# Altium footprint library boxer_pas.PcbLib: 67 footprints (part 2 of 5)
Each footprint in its own frame and in the unit in brackets; x right, y up, seen from the top. Pads: shape width x height; smd on the part's side, far side on the other; paste and mask are expansions set on the pad; w line width, h text height; cw(c..) or ccw(c..) is an arc to the next point about the centre after c.
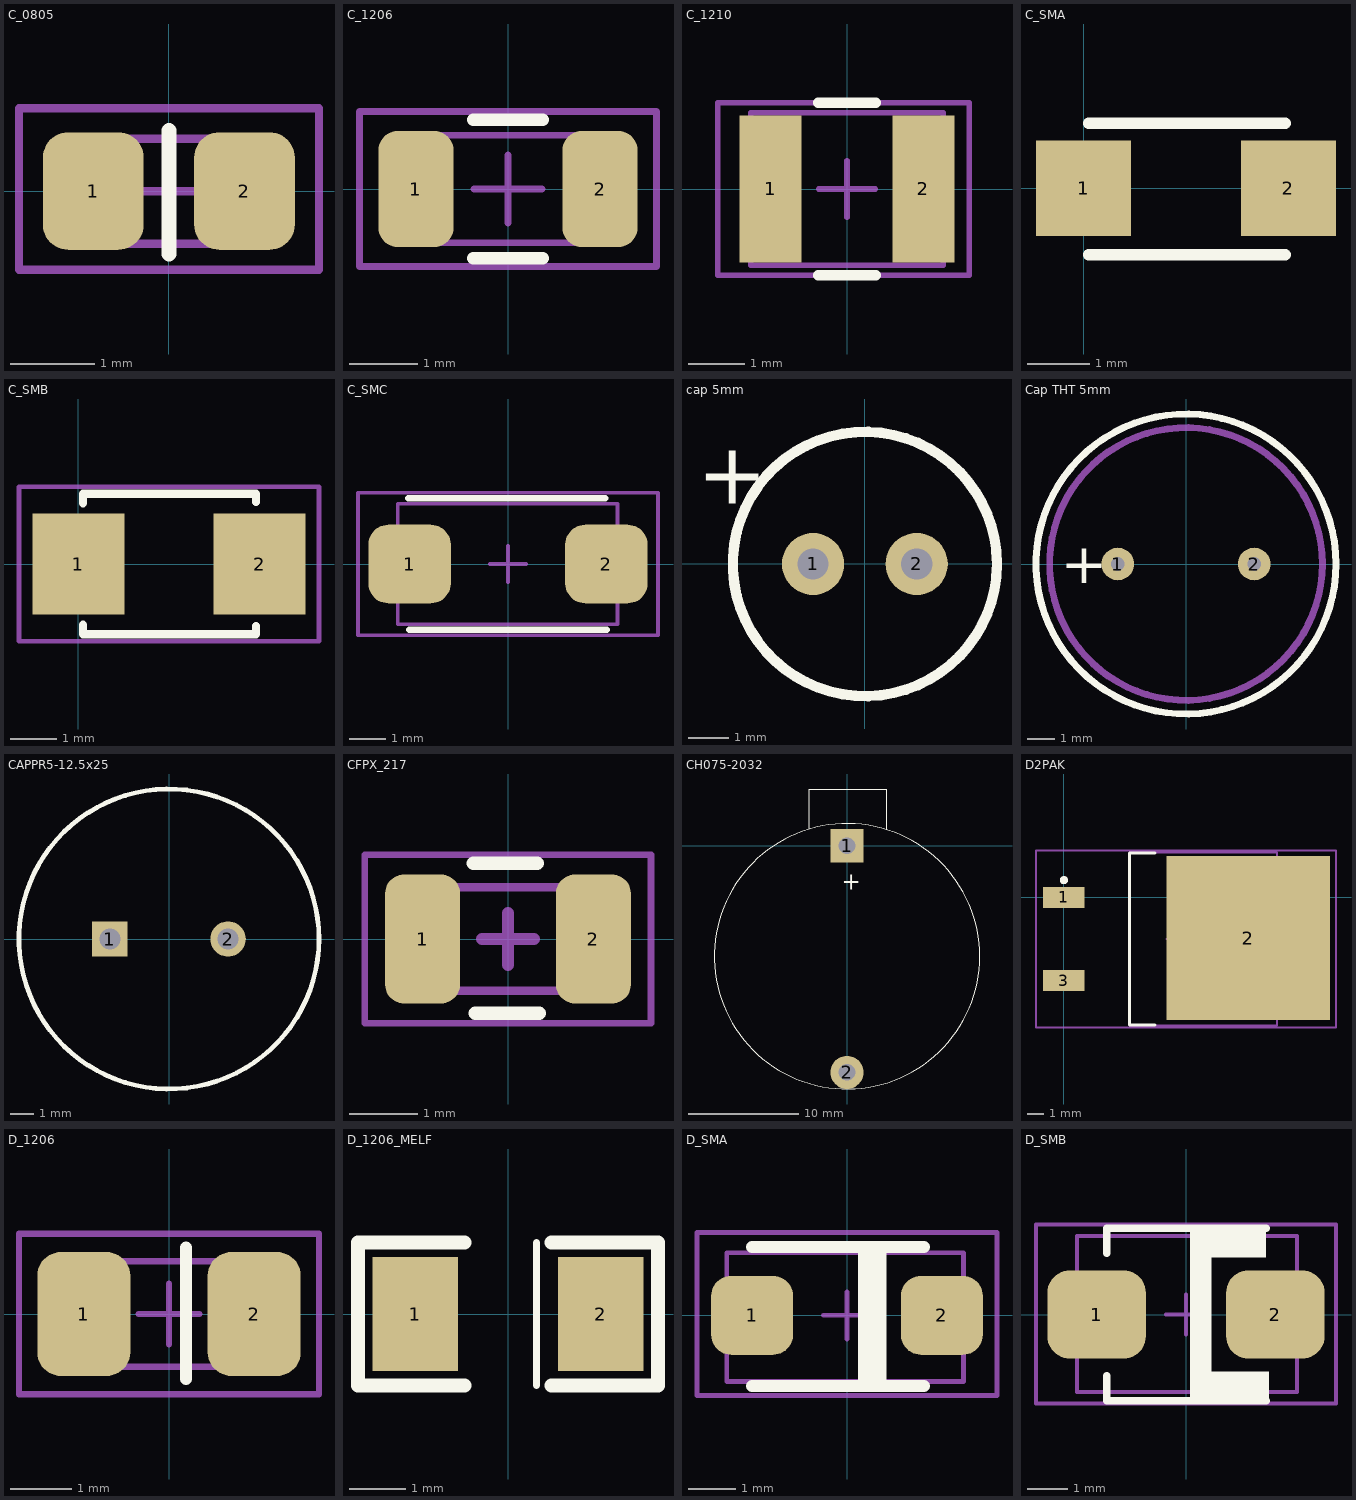
[diagram p1: the footprints below, top view; thin cyan lines are the x and y axes]

## C_0805 [mm] "Chip Capacitor, Body 2.0x1.3mm, IPC High Density"
height 1.4
pads (2):
  rrect50% 1.2x1.4 smd: 1(-0.9,0) 2(0.9,0)
Top Overlay:
  lines w0.18: 0,-0.75 0,0.723
Mechanical 13:
  lines w0.1: -1.011,-0.625 0.989,-0.625 0.989,0.625 -1.011,0.625 -1.011,-0.625
  text ".Value" at -0.925,-0.254 h0.5
  text ".Designator" at -1.651,1.067 h0.5
Mechanical 15:
  lines w0.1: -0.5,0 0.5,0 ; 0,-0.5 0,0.5 ; -1.784,-0.935 1.788,-0.935 1.788,0.986 -1.784,0.986 -1.784,-0.935
3D body "User Library-C0805-2.STEP": height 0.8, standoff 0, extent -1.011,-0.625 0.989,0.625

## C_1206 [mm] "Chip Capacitor, Body 3.2x1.6mm, IPC High Density"
height 1.3
pads (2):
  rrect50% 1.1x1.7 smd: 1(-1.35,0) 2(1.35,0)
Top Overlay:
  lines w0.18: -0.508,-1.016 0.508,-1.016 ; -0.508,1.016 0.508,1.016
Mechanical 13:
  lines w0.1: -1.6,-0.787 -1.6,0.787 1.6,0.787 1.6,-0.787 -1.6,-0.787
  text ".Value" at -0.94,-0.178 h0.5
  text ".Designator" at -1.782,1.147 h0.5
Mechanical 15:
  lines w0.1: -0.5,0 0.5,0 ; 0,-0.5 0,0.5 ; -2.18,-1.138 -2.18,1.138 2.18,1.138 2.18,-1.138 -2.18,-1.138
3D body "User Library-1206 SMD Capacitor.step": height 1, standoff 0, extent -1.6,-0.8 1.6,0.8

## C_1210 [mm] "Chip Capacitor, Body 3.2x2.5mm, IPC High Density"
height 1.3
pads (2):
  rect 1.1x2.6 smd: 1(-1.35,0) 2(1.35,0)
Top Overlay:
  lines w0.18: -0.508,-1.524 0.508,-1.524 ; -0.508,1.524 0.508,1.524
Mechanical 13:
  lines w0.1: -1.7,-1.35 1.7,-1.35 1.7,1.35 -1.7,1.35 -1.7,-1.35
  text ".Value" at -0.965,-0.178 h0.5
  text ".Designator" at -1.731,1.604 h0.5
Mechanical 15:
  lines w0.1: -0.5,0 0.5,0 ; 0,-0.5 0,0.5 ; -2.286,-1.524 2.159,-1.524 2.159,1.524 -2.286,1.524 -2.286,-1.524
3D body "User Library-cap1210.STEP": height 0.95, standoff -0.01, extent -2.128,-1.382 2.072,1.318

## C_SMA [mil] "TAJ Series Standard Tantalum"
height 62.99
pads (2):
  rect 60x60 smd: 1(0,0) 2(129,0)
Top Overlay:
  lines w7.09: 3,-42 127,-42 ; 3,41 127,41
3D body "User Library-CAP_TANT_3216-18_A_case-1.step": height 66.93, standoff 0, extent -1.93,-36 131.93,34.87

## C_SMB [mm]
pads (2):
  rect 2x2.2 smd: 1(0,0) 2(3.937,0)
Top Overlay:
  lines w0.18: 0.102,-1.321 0.102,-1.524 3.861,-1.524 3.861,-1.346 ; 0.102,1.321 0.102,1.524 3.861,1.524 3.861,1.346
Mechanical 13:
  text ".Value" at 0.864,-0.152 h0.5
  text ".Designator" at 0.199,1.782 h0.5
Mechanical 15:
  lines w0.1: -1.291,-1.676 -1.291,1.676 5.228,1.676 5.228,-1.676 -1.291,-1.676
3D body "User Library-Tantalum Capacitor Case B.STEP": height 2.09, standoff -0.01, extent 0.136,-1.474 3.826,1.346

## C_SMC [mil] "TAJ Series Standard Tantalum"
height 102.36
pads (2):
  rrect50% 90x86 smd: 1(-107.5,0) 2(107.5,0)
Top Overlay:
  lines w7.09: -109,72 106,72 ; -108,-72 108,-72
Mechanical 13:
  lines w3.94: -120.57,-65.94 -120.57,65.95 119.59,65.95 119.59,-65.94 -120.57,-65.94
  text ".Value" at -37,-8 h19.68
  text ".Designator" at -75.17,79.14 h19.68
Mechanical 15:
  lines w3.94: -19.69,0 19.68,0 ; 0,-19.69 0,19.68 ; -163.81,-77.75 163.81,-77.75 163.81,77.76 -163.81,77.76 -163.81,-77.75
3D body "User Library-C_case.STEP": height 106.3, standoff 0, extent -120.57,-65.94 119.59,65.95

## cap 5mm [mil]
pads (2):
  round 60 hole 30: 1(-50,0) 2(50,0)
Top Overlay:
  circle w10: c0,0 r127.48
  text "+" at -162,58 h59.06
3D body: height 314.96, standoff 0, extent -118.29,-115 117,120.76

## Cap THT 5mm [mm] "DRE5/2.5 raster 5mm, 10x20mm"
height 20
pads (2):
  round 1.2 hole 0.5: 1(-2.5,0) 2(2.5,0)
Top Overlay:
  circle w0.254: c0,0 r5.5
  text "+" at -4.597,-0.711 h1.5
Mechanical 13:
  circle w0.254: c0,0 r5
3D body: height 12, standoff 0, extent -4.96,-4.99 5,4.99

## CAPPR5-12.5x25 [mm] "Capacitor, Electrolytic, Radial; Body 12.5 x 25 mm (Dia.xH typ); Pin Spacing 5 mm (typ)"
height 22
pads (2):
  rect 1.5x1.5 hole 0.9: 1(-2.5,0)
  round 1.5 hole 0.9: 2(2.5,0)
Top Overlay:
  circle w0.2: c0,0 r6.35
3D body "User Library-Cap-EL(12_5x25-5)T.step": height 25.5, standoff -3.5, extent -6.278,-6.177 6.224,6.323

## CFPX_217 [mm] "3.2 x 1.5mm SMD crystal"
height 1
pads (2):
  rrect50% 1.1x1.9 smd: 1(-1.257,0) 2(1.257,0)
Top Overlay:
  lines w0.2: -0.508,1.118 0.432,1.118 ; -0.483,-1.092 0.457,-1.092
Mechanical 13:
  lines w0.127: -1.572,-0.76 -1.572,0.76 1.648,0.76 1.648,-0.76 -1.572,-0.76
  text ".Designator" at -1.808,1.172 h0.5
  text ".Value" at -0.914,-0.203 h0.5
Mechanical 15:
  lines w0.1: -2.108,-1.24 2.103,-1.24 2.103,1.24 -2.108,1.24 -2.108,-1.24
  lines w0.18: -0.381,0 0,0 ; 0,-0.381 0,0 ; 0,0.381 0,0 ; 0.381,0 0,0
3D body "User Library-ABS07.STEP": height 0.91, standoff 0, extent -1.572,-0.76 1.648,0.76

## CH075-2032 [mm] "Battery Holder, Size: CR2023"
pads (2):
  rect 3x3 hole 1.5: 1(0,0)
  round 3 hole 1.5: 2(0,-20.5)
Top Overlay:
  circle w0.1: c0,-10 r12
  lines w0.1: -3.429,1.506 -3.429,5.133 3.581,5.133 3.581,1.481
  text "+" at -0.466,-3.974 h1.52

## D2PAK [mm] "D2-PAK, 4-Leads, Body 8.8x10.4mm, Pitch 2.54mm, Lead Span 15.1mm, IPC High Density"
height 4.69
pads (3):
  rect 2.54x1.27 smd: 1(0,0) 3(0,-5.08)
  rect 10x10 smd: 2(11.246,-2.489)
Top Overlay:
  circle w0.25: c0,1.05 r0.125
  lines w0.2: 5.55,-7.79 4,-7.79 4,2.71 5.55,2.71
Mechanical 13:
  lines w0.1: 4,-7.815 13,-7.815 13,2.735 4,2.735 4,-7.815
Mechanical 15:
  lines w0.1: 6.25,-2.54 7.25,-2.54 ; 6.75,-3.04 6.75,-2.04 ; -1.702,-7.94 16.598,-7.94 16.598,2.86 -1.702,2.86 -1.702,-7.94
3D body "User Library-DPAK.step": height 4.98, standoff -0.03, extent -0.932,-7.645 14.331,2.515

## D_1206 [mil]
pads (2):
  rrect50% 60x80 smd: 1(-55,0) 2(55,0)
Top Overlay:
  lines w7.87: 11,-42 11,43
Mechanical 13:
  lines w3.94: -65.95,-34.05 65.95,-34.05 65.95,34.05 -65.95,34.05 -65.95,-34.05
  text ".Value" at -39,-9 h19.68
  text ".Designator" at -71.17,51.14 h19.68
Mechanical 15:
  lines w3.94: -19.69,0 19.68,0 ; 0,-19.68 0,19.69 ; -96.81,-51.81 96.81,-51.81 96.81,51.81 -96.81,51.81 -96.81,-51.81
3D body "User Library-D1206.step": height 33.46, standoff 0, extent -65.95,-34.05 65.95,34.05

## D_1206_MELF [mil]
pads (2):
  rect 60x80 smd: 1(-65,0) 2(65,0)
Top Overlay:
  lines w5: 20,-50 20,50
  lines w10: -30.5,-50 -105,-50 -105,50 -30.5,50 ; 30.5,-50 105,-50 105,50 30.5,50
3D body "User Library-smd diode 1206.step": height 56.54, standoff -0.54, extent -68.9,-28.54 68.9,28.54

## D_SMA [mm]
height 2
pads (2):
  rrect50% 1.73x1.67 smd: 1(-2.007,0) 2(2.007,0)
Top Overlay:
  rectangle: 0.229,-1.473 0.686,1.448
  lines w0.254: -2.007,-1.499 1.626,-1.499 ; -2.007,1.448 1.626,1.448 ; 0.686,1.422 0.686,1.448
  lines w0.3: 0.686,-1.473 0.686,1.422
Mechanical 13:
  lines w0.1: -2.54,-1.397 2.464,-1.397 2.464,1.321 -2.54,1.321 -2.54,-1.397
  text ".Value" at -0.94,-0.229 h0.5
  text ".Designator" at -1.731,1.655 h0.5
Mechanical 15:
  lines w0.1: -0.5,0 0.5,0 ; 0,-0.5 0,0.5 ; -3.17,-1.697 3.17,-1.697 3.17,1.753 -3.17,1.753 -3.17,-1.697
3D body "User Library-Diode Molded Body.step": height 2.28, standoff -0.03, extent -2.551,-1.375 2.449,1.324

## D_SMB [mil]
pads (2):
  rrect50% 97x87 smd: 1(-88,0) 2(88,0)
Top Overlay:
  rectangle: 19,-85 82,-56
  rectangle: 4,-87 25,84
  rectangle: 16,56 79,85
  lines w7.09: -78,-60 -78,-85 79,-85 ; -78,60 -78,85 79,85
Mechanical 13:
  lines w3.94: -107.27,-76.27 -107.27,77.27 109.27,77.27 109.27,-76.27 -107.27,-76.27
  text ".Value" at -39,-8 h19.68
  text ".Designator" at -75.17,90.14 h19.68
Mechanical 15:
  lines w3.94: -19.69,0 19.68,0 ; 0,-19.68 0,19.69 ; -147.81,-87.81 -147.81,88.81 147.81,88.81 147.81,-87.81 -147.81,-87.81
3D body "User Library-DIOM5539X24.step": height 96.46, standoff 1.09, extent -107.28,-76.28 109.26,77.26